# Altium footprint library Connector.PcbLib: 231 footprints (part 14 of 15)
Each footprint in its own frame and in the unit in brackets; x right, y up, seen from the top. Pads: shape width x height; smd on the part's side, far side on the other; paste and mask are expansions set on the pad; w line width, h text height; cw(c..) or ccw(c..) is an arc to the next point about the centre after c.
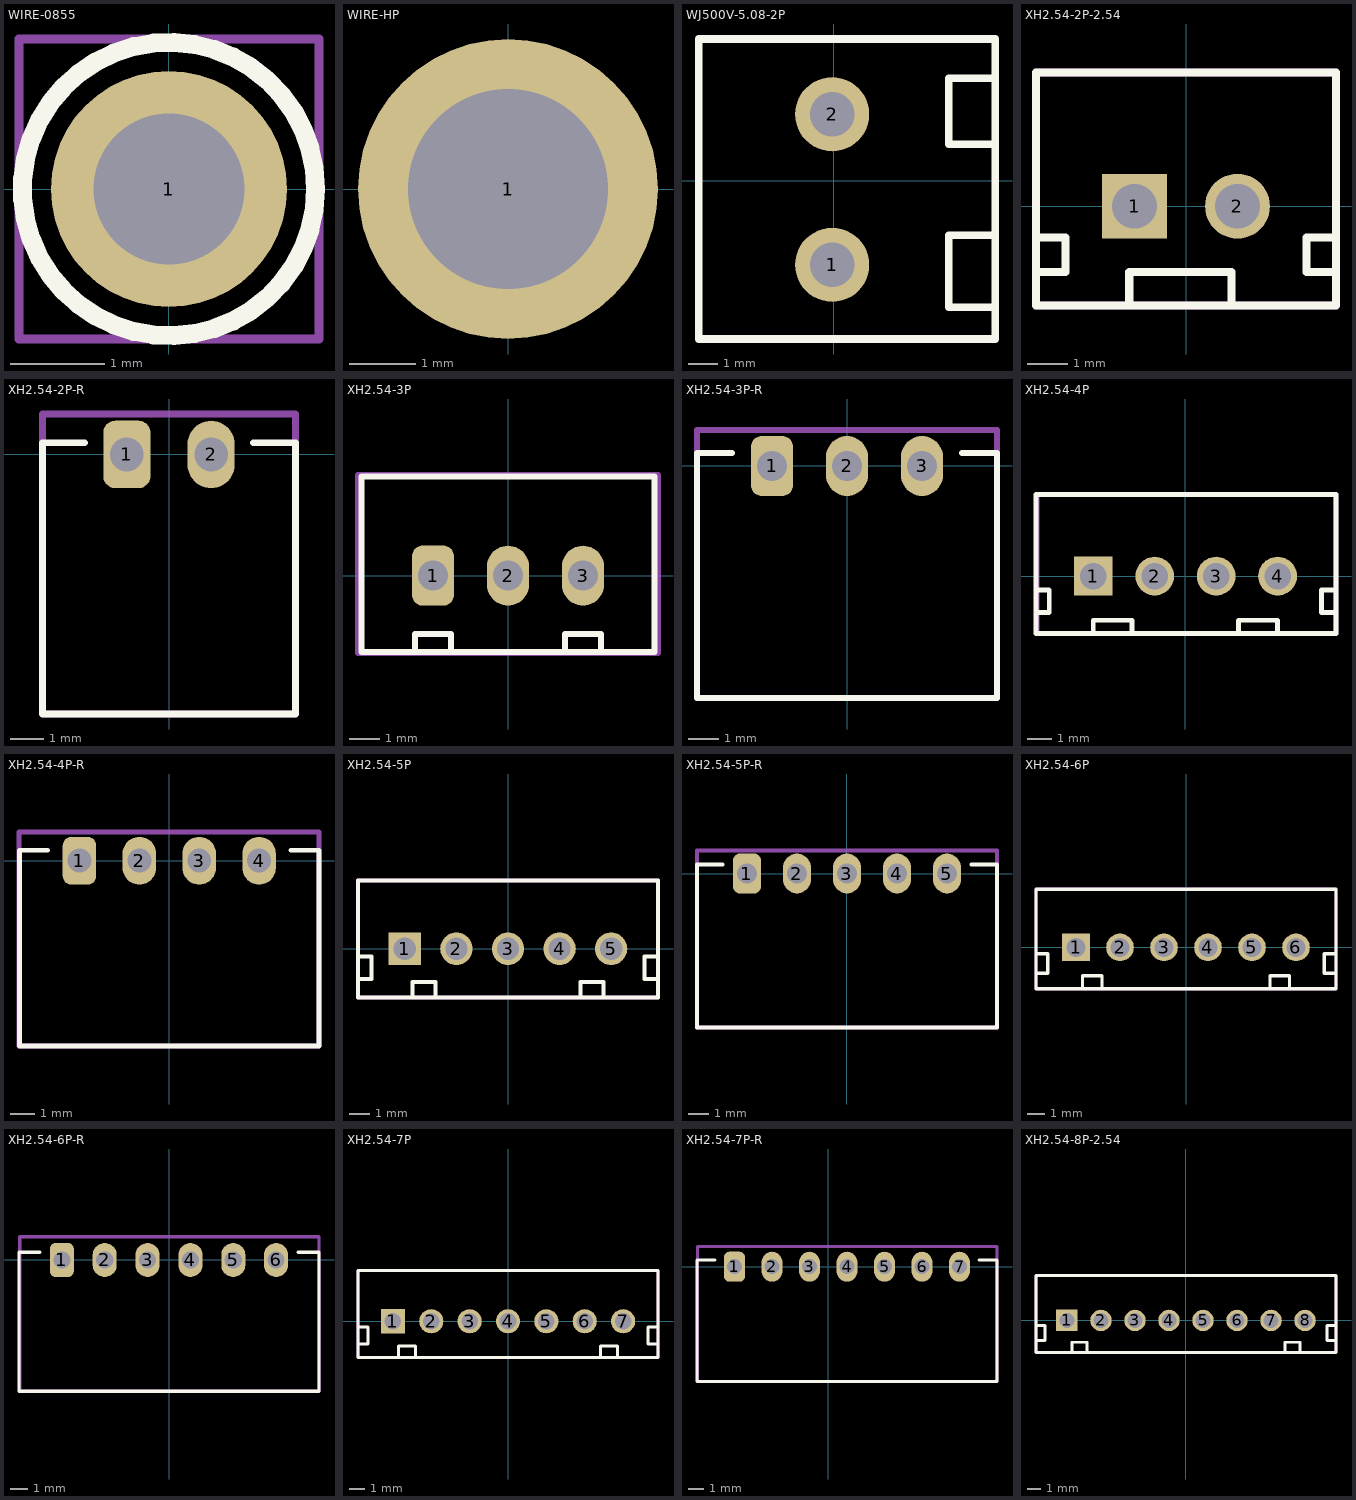
[diagram p13: the footprints below, top view; thin cyan lines are the x and y axes]

## WIRE-0855 [mm]
pads (1):
  round 2.5 hole 1.6: 1(0,0)
Top Overlay:
  circle w0.2: c0,0 r1.552
Mechanical 13:
  lines w0.1: -1.587,-1.587 1.588,-1.587 1.588,1.588 -1.587,1.588 -1.587,-1.587
  text ".Designator" at -1.5,-0.3 h1
Mechanical 15:
  lines w0.1: -1.587,-1.587 1.588,-1.587 1.588,1.588 -1.587,1.588 -1.587,-1.587
  text ".Comment" at -1.5,-0.3 h1
3D body "mill-max-0855-0-15-20-82-14-11-0.step": height 14.25, standoff -2.23, extent -1.587,-1.587 1.588,1.588

## WIRE-HP [mm]
pads (1):
  round 4.5 hole 3: 1(0,0)

## WJ500V-5.08-2P [mm]
pads (2):
  round 2.5 hole 1.5: 1(-0.05,-2.83) 2(-0.05,2.25)
Top Overlay:
  lines w0.254: 5.375,-4.255 3.875,-4.255 3.875,-1.83 5.45,-1.83 ; 5.425,1.245 3.875,1.245 3.875,3.47 5.425,3.47 ; -4.55,-5.33 -4.55,4.79 5.45,4.79 5.45,-5.33 -4.55,-5.33
Mechanical 13:
  text ".Designator" at 2.841,-5.105 h1.5
3D body "User Library-Terminal-Screw-3A-2way.STEP": height 10, standoff -3, extent -3.7,-5.98 3.9,4.62
3D body "User Library-TER-KF128-2P.step": height 14.35, standoff -4.95, extent -5.35,-6.08 5.15,4.68

## XH2.54-2P-2.54 [mm]
pads (2):
  rect 1.6x1.6 hole 1.1: 1(-1.27,0)
  round 1.6 hole 1.1: 2(1.27,0)
Top Overlay:
  lines w0.2: -3.7,-0.775 -2.975,-0.775 -2.975,-1.625 -3.675,-1.625 ; -1.4,-2.425 -1.4,-1.625 1.125,-1.625 1.125,-2.425 ; 3.675,-1.625 2.975,-1.625 2.975,-0.775 3.7,-0.775 ; -3.7,-2.45 -3.7,3.3 3.7,3.3 3.7,-2.45 -3.7,-2.45
Mechanical 13:
  lines w0.2: -3.7,-2.45 -3.7,3.3 3.7,3.3 3.7,-2.45 -3.7,-2.45
  text ".Designator" at -2.05,-0.217 h1.5
Mechanical 15:
  lines w0.2: -3.7,-2.45 -3.7,3.3 3.7,3.3 3.7,-2.45 -3.7,-2.45
3D body "JST - XH - Thru (V) - 2Pin - 2.54mm.stp": height 7.21, standoff -3, extent -3.607,-2.489 3.607,3.353

## XH2.54-2P-R [mm]
pads (2):
  rrect50% 1.4x2 hole 1: 1(-1.25,0)
  oval 1.4x2 hole 1: 2(1.25,0)
Top Overlay:
  lines w0.2: -2.5,0.35 -3.75,0.35 -3.75,-7.7 3.75,-7.7 3.75,0.35 2.5,0.35
Mechanical 13:
  lines w0.2: -3.75,-7.7 3.75,-7.7 3.75,1.2 -3.75,1.2 -3.75,-7.7
  text ".Designator" at -2.2,-3.672 h2
3D body "JST - XH - Thru (R) - 2Pin - 2.54mm.stp": height 5.84, standoff -3.38, extent -3.607,-7.709 3.607,0.328

## XH2.54-3P [mm]
pads (3):
  rrect50% 1.4x2 hole 1: 1(-2.5,0)
  oval 1.4x2 hole 1: 2(0,0) 3(2.5,0)
Top Overlay:
  lines w0.2: -3.097,-2.539 -3.097,-1.95 -1.903,-1.95 -1.903,-2.539 ; 1.903,-2.539 1.903,-1.95 3.097,-1.95 3.097,-2.539 ; -4.877,-2.539 4.877,-2.539 4.877,3.303 -4.877,3.303 -4.877,-2.539
Mechanical 13:
  lines w0.2: -5,-2.575 -5,3.35 5,3.35 5,-2.575 -5,-2.575
  text ".Designator" at -3.825,0.028 h2
3D body "JST - XH - Thru (V) - 3Pin - 2.54mm.stp": height 7.21, standoff -3, extent -4.877,-2.539 4.877,3.303

## XH2.54-3P-R [mm]
pads (3):
  rrect50% 1.4x2 hole 1: 1(-2.5,0)
  oval 1.4x2 hole 1: 2(0,0) 3(2.5,0)
Top Overlay:
  lines w0.2: -3.825,0.44 -5,0.44 -5,-7.734 5,-7.734 5,0.44 3.825,0.44
Mechanical 13:
  lines w0.2: -5,-7.734 -5,1.2 5,1.2 5,-7.734 -5,-7.734
  text ".Designator" at -2.2,-3.472 h2
3D body "JST - XH - Thru (R) - 3Pin - 2.54mm.stp": height 5.84, standoff -3.38, extent -4.877,-7.734 4.876,0.302

## XH2.54-4P [mm]
pads (4):
  rect 1.6x1.6 hole 1.1: 1(-3.81,0)
  round 1.6 hole 1.1: 2(-1.27,0) 3(1.27,0) 4(3.81,0)
Top Overlay:
  lines w0.2: -6.175,-1.5 -5.625,-1.5 -5.625,-0.575 -6.175,-0.575 ; -3.81,-2.375 -3.81,-1.825 -2.2,-1.825 -2.2,-2.375 ; 2.2,-2.375 2.2,-1.825 3.81,-1.825 3.81,-2.375 ; 6.175,-1.5 5.625,-1.5 5.625,-0.575 6.175,-0.575 ; -6.175,-2.375 -6.175,3.375 6.225,3.375 6.225,-2.375 -6.175,-2.375
Mechanical 13:
  lines w0.2: -6.137,-2.369 -6.137,3.375 6.225,3.375 6.225,-2.369 -6.137,-2.369
  text ".Designator" at -2.6,-0.292 h1.5
3D body "JST - XH - Thru (V) - 4Pin - 2.54mm.stp": height 7.21, standoff -3, extent -6.147,-2.489 6.147,3.353

## XH2.54-4P-R [mm]
pads (4):
  rrect50% 1.4x2 hole 1: 1(-3.75,0)
  oval 1.4x2 hole 1: 2(-1.25,0) 3(1.25,0) 4(3.75,0)
Top Overlay:
  lines w0.2: -5.075,0.44 -6.25,0.44 -6.25,-7.736 6.25,-7.736 6.25,0.44 5.075,0.44
Mechanical 13:
  lines w0.2: -6.275,-7.736 -6.275,1.2 6.25,1.2 6.25,-7.736 -6.275,-7.736
  text ".Designator" at -3.5,-3.447 h2
3D body "JST - XH - Thru (R) - 4Pin - 2.54mm.stp": height 5.84, standoff -3.38, extent -6.147,-7.736 6.147,0.3

## XH2.54-5P [mm]
pads (5):
  rect 1.6x1.6 hole 1.1: 1(-5.08,0)
  round 1.6 hole 1.1: 2(-2.54,0) 3(0,0) 4(2.54,0) 5(5.08,0)
Top Overlay:
  lines w0.2: -7.39,-1.5 -6.715,-1.5 -6.715,-0.375 -7.39,-0.375 ; -4.705,-2.31 -4.705,-1.635 -3.58,-1.635 -3.58,-2.31 ; 3.58,-2.31 3.58,-1.635 4.705,-1.635 4.705,-2.31 ; 7.39,-1.5 6.715,-1.5 6.715,-0.375 7.39,-0.375 ; 7.39,3.353 7.39,-0.375 ; 7.39,3.36 -7.39,3.36 -7.39,-2.4 7.39,-2.4 7.39,-0.375
Mechanical 13:
  lines w0.2: -7.39,-2.4 7.39,-2.4 7.39,3.36 -7.39,3.36 -7.39,-2.4
  text ".Designator" at -4.28,-0.228 h1.5
3D body "JST - XH - Thru (V) - 5Pin - 2.54mm.stp": height 7.21, standoff -3, extent -7.417,-2.489 7.417,3.353

## XH2.54-5P-R [mm]
pads (5):
  rrect50% 1.4x2 hole 1: 1(-5,0)
  oval 1.4x2 hole 1: 2(-2.5,0) 3(0,0) 4(2.5,0) 5(5,0)
Top Overlay:
  lines w0.2: -6.225,0.45 -7.5,0.45 -7.5,-7.7 7.5,-7.7 7.5,0.45 6.225,0.45
Mechanical 13:
  lines w0.2: -7.5,-7.7 -7.5,1.15 7.5,1.15 7.5,-7.7 -7.5,-7.7
  text ".Designator" at -3.075,-3.797 h2
3D body "JST - XH - Thru (R) - 5Pin - 2.54mm.stp": height 5.84, standoff -3.38, extent -7.417,-7.686 7.417,0.35

## XH2.54-6P [mm]
pads (6):
  rect 1.6x1.6 hole 1.1: 1(-6.35,0)
  round 1.6 hole 1.1: 2(-3.81,0) 3(-1.27,0) 4(1.27,0) 5(3.81,0) 6(6.35,0)
Top Overlay:
  lines w0.2: -8.66,-1.5 -7.985,-1.5 -7.985,-0.375 -8.66,-0.375 ; -5.975,-2.31 -5.975,-1.635 -4.85,-1.635 -4.85,-2.31 ; 4.85,-2.31 4.85,-1.635 5.975,-1.635 5.975,-2.31 ; 8.66,-1.5 7.985,-1.5 7.985,-0.375 8.66,-0.375 ; -8.66,-2.4 8.66,-2.4 8.66,3.36 -8.66,3.36 -8.66,-2.4
Mechanical 13:
  lines w0.2: -8.66,-2.4 8.66,-2.4 8.66,3.36 -8.66,3.36 -8.66,-2.4
  text ".Designator" at -3,-0.142 h1.5
3D body "JST - XH - Thru (V) - 6Pin - 2.54mm.stp": height 7.21, standoff -3, extent -8.687,-2.489 8.687,3.353

## XH2.54-6P-R [mm]
pads (6):
  rrect50% 1.4x2 hole 1: 1(-6.25,0)
  oval 1.4x2 hole 1: 2(-3.75,0) 3(-1.25,0) 4(1.25,0) 5(3.75,0) 6(6.25,0)
Top Overlay:
  lines w0.2: -7.55,0.44 -8.75,0.44 -8.75,-7.65 8.75,-7.65 8.75,0.44 7.55,0.44
Mechanical 13:
  lines w0.2: -8.7,-7.65 -8.7,1.35 8.75,1.35 8.75,-7.65 -8.7,-7.65
  text ".Designator" at -2.8,-3.947 h2
3D body "JST - XH - Thru (R) - 6Pin - 2.54mm.stp": height 5.84, standoff -3.38, extent -8.687,-7.661 8.687,0.375

## XH2.54-7P [mm]
pads (7):
  rect 1.6x1.6 hole 1.1: 1(-7.636,0.009)
  round 1.6 hole 1.1: 2(-5.096,0.009) 3(-2.556,0.009) 4(-0.016,0.009) 5(2.524,0.009) 6(5.064,0.009) 7(7.604,0.009)
Top Overlay:
  lines w0.2: -9.945,-1.491 -9.271,-1.491 -9.271,-0.366 -9.945,-0.366 ; -7.261,-2.3 -7.261,-1.626 -6.136,-1.626 -6.136,-2.3 ; 6.104,-2.3 6.104,-1.626 7.229,-1.626 7.229,-2.3 ; 9.914,-1.491 9.239,-1.491 9.239,-0.366 9.914,-0.366 ; -9.945,-2.391 9.914,-2.391 9.914,3.37 -9.945,3.37 -9.945,-2.391
Mechanical 13:
  lines w0.2: -9.945,-2.391 9.914,-2.391 9.914,3.37 -9.945,3.37 -9.945,-2.391
  text ".Designator" at -4.286,-0.133 h1.5
3D body "JST - XH - Thru (V) - 7Pin - 2.54mm.stp": height 7.21, standoff -3, extent -9.972,-2.48 9.941,3.362

## XH2.54-7P-R [mm]
pads (7):
  rrect50% 1.4x2 hole 1: 1(-6.25,0)
  oval 1.4x2 hole 1: 2(-3.75,0) 3(-1.25,0) 4(1.25,0) 5(3.75,0) 6(6.25,0) 7(8.75,0)
Top Overlay:
  lines w0.2: -7.55,0.44 -8.75,0.44 -8.75,-7.65 11.25,-7.65 11.25,0.44 10.05,0.44
Mechanical 13:
  lines w0.2: -8.7,-7.65 -8.7,1.35 11.25,1.35 11.25,-7.65 -8.7,-7.65
  text ".Designator" at -2.8,-3.947 h2
3D body "JST - XH - Thru (R) - 7Pin - 2.54mm.stp": height 5.84, standoff -3.38, extent -8.682,-7.65 11.232,0.386

## XH2.54-8P-2.54 [mm]
pads (8):
  rect 1.6x1.6 hole 1.1: 1(-8.89,0)
  round 1.6 hole 1.1: 2(-6.35,0) 3(-3.81,0) 4(-1.27,0) 5(1.27,0) 6(3.81,0) 7(6.35,0) 8(8.89,0)
Top Overlay:
  lines w0.2: -11.2,-1.5 -10.525,-1.5 -10.525,-0.375 -11.2,-0.375 ; -8.515,-2.31 -8.515,-1.635 -7.39,-1.635 -7.39,-2.31 ; 7.39,-2.31 7.39,-1.635 8.515,-1.635 8.515,-2.31 ; 11.2,-1.5 10.525,-1.5 10.525,-0.375 11.2,-0.375 ; -11.2,-2.4 -11.2,3.36 11.2,3.36 11.2,-2.4 -11.2,-2.4
Mechanical 13:
  lines w0.2: -11.2,-2.4 -11.2,3.36 11.2,3.36 11.2,-2.4 -11.2,-2.4
  text ".Designator" at -3.825,-0.292 h1.5
3D body "B8B-XH-A.STEP": height 7, standoff -3.4, extent -11.2,-2.4 11.2,3.35